# Altium footprint library yedek aviyonik.PcbLib: 13 footprints
Each footprint in its own frame and in the unit in brackets; x right, y up, seen from the top. Pads: shape width x height; smd on the part's side, far side on the other; paste and mask are expansions set on the pad; w line width, h text height; cw(c..) or ccw(c..) is an arc to the next point about the centre after c.
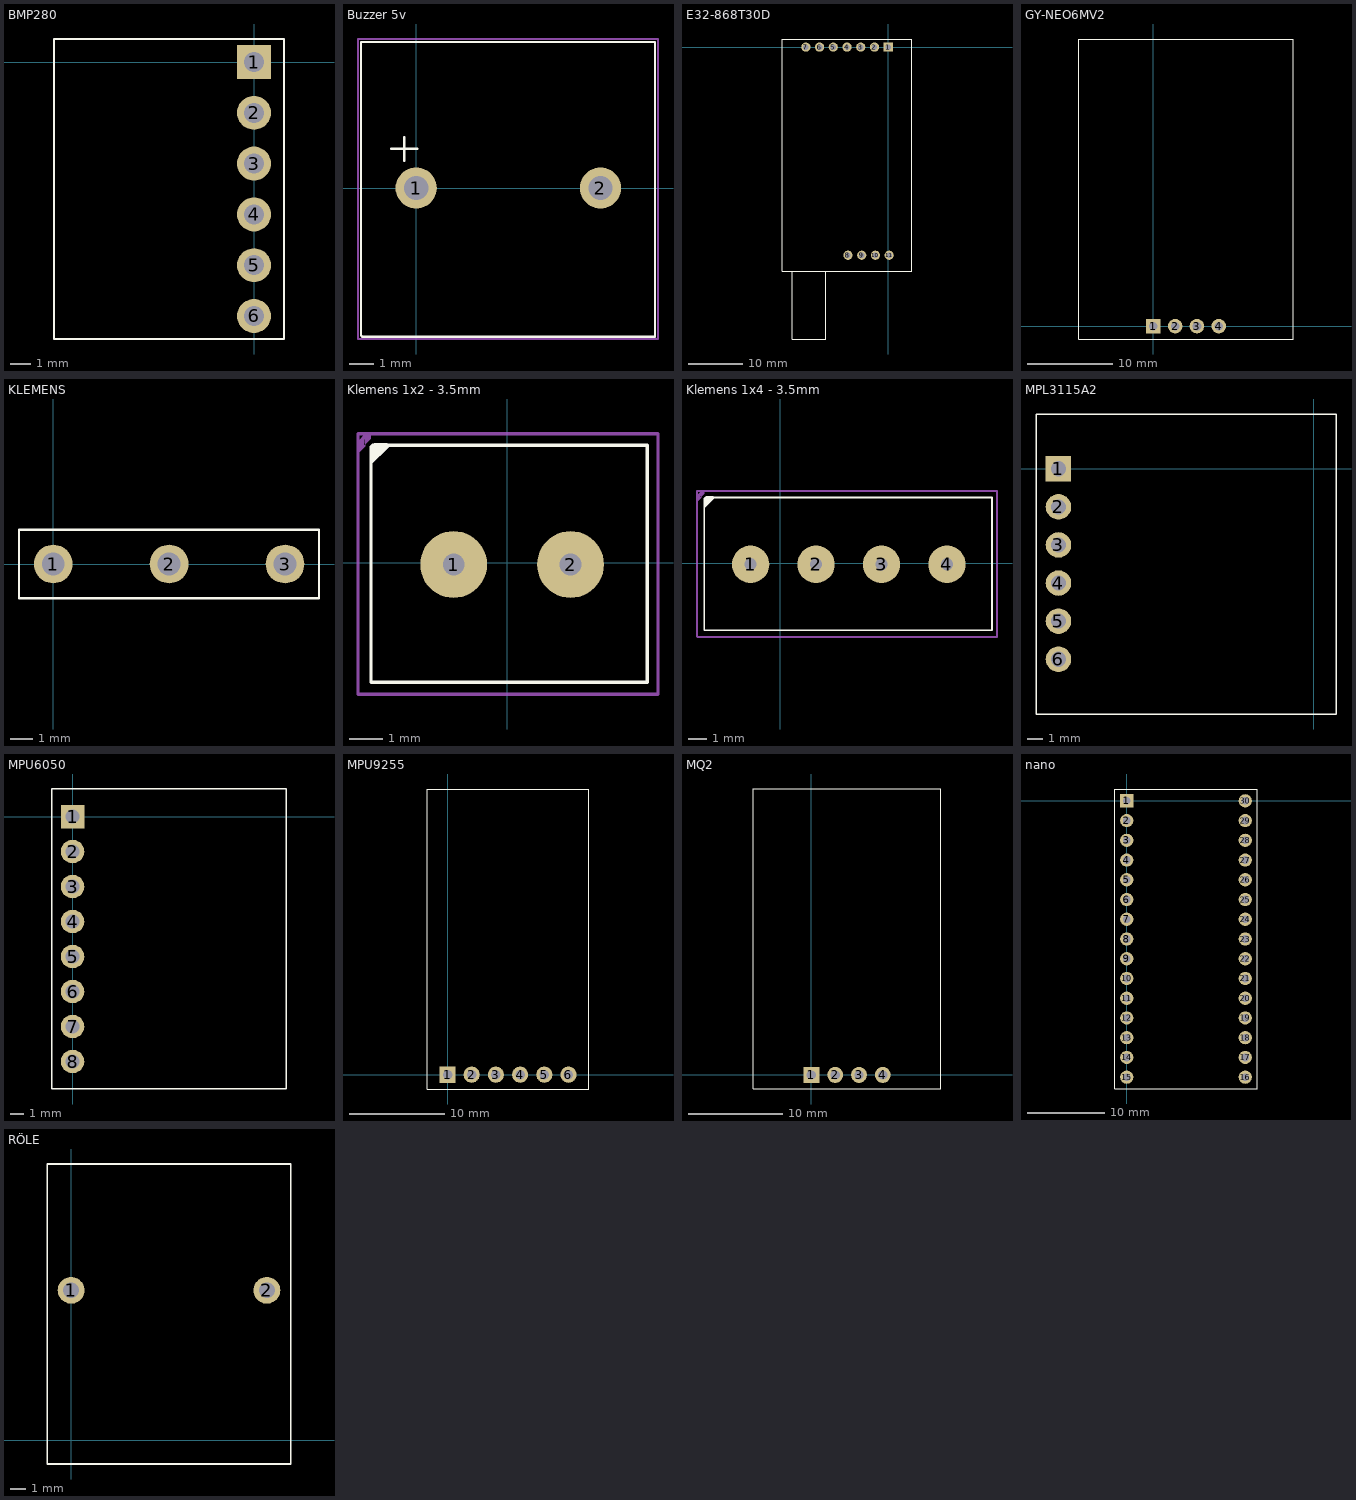
[diagram p0: the footprints below, top view; thin cyan lines are the x and y axes]

## BMP280 [mm]
pads (6):
  rect 1.7x1.7 hole 1: 1(0,0)
  round 1.7 hole 1: 2(0,-2.54) 3(0,-5.08) 4(0,-7.62) 5(0,-10.16) 6(0,-12.7)
Top Overlay:
  lines w0.1: -10,-13.85 1.5,-13.85 1.5,0 1.5,1.15 -10,1.15 -10,-13.85
3D body "bmp280_module.stp": height 5.67, standoff -7.03, extent -9.475,-13.99 1.525,1.25

## Buzzer 5v [mm]
pads (2):
  round 1.7 hole 1 mask+0.05: 1(0,0) 2(7.6,0)
Top Overlay:
  lines w0.1: -1.025,1.625 0.05,1.625 ; -0.5,1.125 -0.5,2.1 ; -2.275,-6.075 -2.275,6.025 9.85,6.025 9.85,-6.125 -2.225,-6.125 -2.275,-6.075
Mechanical 3:
  lines w0.1: -2.4,-6.225 -2.4,6.15 9.975,6.15 9.975,-6.225 -2.4,-6.225
3D body "cem-1205c.stp": height 9.5, standoff -4.5, extent -2.2,-6.05 9.8,5.95

## E32-868T30D [mm]
pads (11):
  rect 1.7x1.7 hole 1: 1(0,0)
  round 1.7 hole 1: 2(-2.54,0) 3(-5.08,0) 4(-7.62,0) 5(-10.16,0) 6(-12.7,0) 7(-15.24,0) 8(-7.445,-38.5) 9(-4.905,-38.5) 10(-2.365,-38.5) 11(0.175,-38.5)
Top Overlay:
  lines w0.1: -17.725,-41.5 -17.725,-54 -14.625,-54 -11.525,-54 -11.525,-41.5 ; -19.625,-41.5 -19.625,1.5 4.375,1.5 4.375,0 4.375,-41.5 -19.625,-41.5
3D body "E32-868T30D_Assembly_with_All_Headers.STEP": height 7.57, standoff -7.09, extent -19.625,-54.2 4.375,1.5

## GY-NEO6MV2 [mm]
pads (4):
  rect 1.7x1.7 hole 1: 1(0,0)
  round 1.7 hole 1: 2(2.54,0) 3(5.08,0) 4(7.62,0)
Top Overlay:
  lines w0.1: -8.7,-1.5 -8.7,0 -8.7,33.5 16.3,33.5 16.3,0 16.3,-1.5 -8.7,-1.5
3D body "User Library-User Library-GY-GPS6MV2 v1.step": height 6.07, standoff -3.93, extent -9.5,-1.875 16.7,33.525

## KLEMENS [mm]
pads (3):
  round 1.7 hole 1: 1(0,0) 2(5.08,0) 3(10.16,0)
Top Overlay:
  lines w0.1: -1.5,-1.5 -1.5,0 -1.5,1.5 11.65,1.5 11.65,0 11.65,-1.5 -1.5,-1.5
3D body "User Library-MSTB 2,5-3-G-5,08 1759020.STEP": height 8.3, standoff -3.8, extent -2.62,-9.952 12.62,2.05

## Klemens 1x2 - 3.5mm [mm]
pads (2):
  round 2 hole 0.65: 1(-1.6,-0.05) 2(1.9,-0.05)
Top Overlay:
  region: -3.533,3.482 -4.106,2.909 -4.106,3.444 -3.972,3.577 -3.593,3.577
  lines w0.1: -4.075,3.475 -4.075,-3.575 4.2,-3.575 4.2,3.525 -4.025,3.525
Mechanical 3:
  region: -4.248,3.86 -4.464,3.644 -4.464,3.861 -4.462,3.86 -4.248,3.86 -4.248,3.496 -4.462,3.282 -4.462,3.86 -4.248,3.86 -4.241,3.853 -4.082,3.853 -4.082,3.709 -4.285,3.507
  lines w0.1: -4.462,-3.922 -4.462,3.86 -4.248,3.86 4.517,3.86 4.517,-3.931 -4.453,-3.931 -4.462,-3.922
3D body "terminal_blocks_a-tb350-te02.stp": height 8.9, standoff -3.29, extent -3.9,-3.45 4.094,3.55

## Klemens 1x4 - 3.5mm [mm]
pads (4):
  round 2 hole 0.65: 1(-1.6,-0.05) 2(1.9,-0.05) 3(5.4,-0.05) 4(8.9,-0.05)
Top Overlay:
  region: -3.533,3.482 -4.106,2.909 -4.106,3.444 -3.972,3.577 -3.593,3.577
  lines w0.1: -4.075,3.475 -4.075,-3.575 11.3,-3.575 11.3,3.525 -4.025,3.525
Mechanical 3:
  region: -4.248,3.86 -4.464,3.644 -4.464,3.861 -4.462,3.86 -4.248,3.86 -4.248,3.496 -4.462,3.282 -4.462,3.86 -4.248,3.86 -4.241,3.853 -4.082,3.853 -4.082,3.709 -4.285,3.507
  lines w0.1: -4.462,-3.922 -4.453,-3.931 11.575,-3.931 11.575,3.86 -4.248,3.86 -4.462,3.86 -4.462,-3.922
3D body "terminal_blocks_a-tb350-te02.stp": height 8.9, standoff -3.29, extent 3.1,-3.45 11.094,3.55
3D body "terminal_blocks_a-tb350-te02.stp": height 8.9, standoff -3.29, extent -3.9,-3.45 4.094,3.55

## MPL3115A2 [mm]
pads (6):
  rect 1.7x1.7 hole 1: 1(-17,0)
  round 1.7 hole 1: 2(-17,-2.54) 3(-17,-5.08) 4(-17,-7.62) 5(-17,-10.16) 6(-17,-12.7)
Top Overlay:
  lines w0.1: -18.5,-16.35 1.5,-16.35 1.5,3.65 -18.5,3.65 -18.5,0 -18.5,-16.35
3D body "bmp280_module.stp": height 6.77, standoff -5.93, extent -18.475,-14.045 -7.475,1.195

## MPU6050 [mm]
pads (8):
  rect 1.7x1.7 hole 1: 1(0,0)
  round 1.7 hole 1: 2(0,-2.54) 3(0,-5.08) 4(0,-7.62) 5(0,-10.16) 6(0,-12.7) 7(0,-15.24) 8(0,-17.78)
Top Overlay:
  lines w0.1: -1.5,-19.775 15.5,-19.775 15.5,2 -1.5,2 -1.5,0 -1.5,-19.775
3D body "MPU 6050 IMU.STEP": height 5.74, standoff -5.43, extent -1.275,-19.332 14.6,1.775

## MPU9255 [mm]
pads (6):
  rect 1.7x1.7 hole 1: 1(0,0)
  round 1.7 hole 1: 2(2.54,0) 3(5.08,0) 4(7.62,0) 5(10.16,0) 6(12.7,0)
Top Overlay:
  lines w0.1: -2.15,-1.5 -2.15,0 -2.15,30 14.85,30 14.85,0 14.85,-1.5 -2.15,-1.5
3D body "Pin Header 1x6 TH Pitch 2.54mm.stp": height 5.7, standoff -7, extent -1.25,-1.345 13.99,1.195
3D body: height 1, standoff 0, extent -2.15,-1.5 14.85,29.975

## MQ2 [mm]
pads (4):
  rect 1.7x1.7 hole 1: 1(0,0)
  round 1.7 hole 1: 2(2.54,0) 3(5.08,0) 4(7.62,0)
Top Overlay:
  lines w0.1: -6.2,-1.5 13.8,-1.5 13.8,30.5 -6.2,30.5 -6.2,0 -6.2,-1.5
3D body "MQ2 Gas Sensor.SLDPRT": height 19, standoff -2.5, extent -6.3,-7.775 13.8,28.475

## nano [mm]
pads (30):
  rect 1.7x1.7 hole 1: 1(0,0)
  round 1.7 hole 1: 2(0,-2.54) 3(0,-5.08) 4(0,-7.62) 5(0,-10.16) 6(0,-12.7) 7(0,-15.24) 8(0,-17.78) 9(0,-20.32) 10(0,-22.86) 11(0,-25.4) 12(0,-27.94) 13(0,-30.48) 14(0,-33.02) 15(0,-35.56) 16(15.24,-35.56) 17(15.24,-33.02) 18(15.24,-30.48) 19(15.24,-27.94) 20(15.24,-25.4) 21(15.24,-22.86) 22(15.24,-20.32) 23(15.24,-17.78) 24(15.24,-15.24) 25(15.24,-12.7) 26(15.24,-10.16) 27(15.24,-7.62) 28(15.24,-5.08) 29(15.24,-2.54) 30(15.24,0)
Top Overlay:
  lines w0.1: -1.524,-37.084 16.764,-37.084 16.764,0 16.764,1.524 -1.524,1.524 -1.524,-35.56 -1.524,-37.084
3D body "arduino nano.STEP": height 12.25, standoff -6.35, extent -1.4,-41.15 16.6,3.85

## RÖLE [mm]
pads (2):
  round 1.7 hole 1: 1(0,9.5) 2(12.4,9.5)
Top Overlay:
  lines w0.1: -1.5,-1.5 13.9,-1.5 13.9,17.5 -1.5,17.5 -1.5,0 -1.5,-1.5